# Altium schematic symbol library Schlib.SchLib: 725 symbols (part 4 of 6) (continued)
## RC0201FR-075R1L (continued)
SMD Chip Resistor, 5.1 Ohm, ï¿½ 1%, 50 mW, 0201 [0603 Metric], Thick Film, General Purpose; Manufacturer: Yageo; Manufacturer Part Number: RC0201FR-075R1L; Voltage Rating: 25V; Supplier: Future Electronics; Supplier Part Number: 8107900; RoHS: Yes; Category: Chip SMD Resistors; Stock: 70000; Pricing: 10000=0.0031, 50000=0.003, 300000=0.0028, 1000000=0.0027, 3000000=0.0025 (USD); RoHS Compliant: 5897YesNo; ComponentLink1URL: http://www.yageo.com/documents/recent/PYu-RC_Group_51_RoHS_L_9.pdf?src-supplier=Digikey; ComponentLink1Description: http://www.yageo.com/documents/recent/PYu-RC_Group_51_RoHS_L_9.pdf?src-supplier=Digikey; ComponentLink2URL: https://datasheet.octopart.com/RC0201FR-075R1L-Yageo-datasheet-164759695.pdf?src-supplier=Future+Electronics; ComponentLink2Description: https://datasheet.octopart.com/RC0201FR-075R1L-Yageo-datasheet-164759695.pdf?src-supplier=Future+Electronics; Case/Package: 0201
footprint R 0201 (0603 Metric)
pins: 1 B, 2 A

## RC0402FR-072K55L
designator R?  value 2.55kR  (hidden comment: *)
SMD Chip Resistor, 2.55 kOhm, ± 1%, 63 mW, 0402 [1005 Metric], Thick Film, General Purpose; Manufacturer: Yageo; Manufacturer Part Number: RC0402FR-072K55L; Supplier: Arrow Electronics; Supplier Part Number: RC0402FR-072K55L; RoHS: Yes; Category: Chip SMD Resistors; Stock: 50000; Pricing: 10000=0.0018, 50000=0.0015, 100000=0.001 (USD); ComponentLink1URL: https://datasheet.ciiva.com/12575/pyu-rc0402-51-rohs-l-6-r-8721-12575052.pdf?src-supplier=Mouser; ComponentLink1Description: https://datasheet.ciiva.com/12575/pyu-rc0402-51-rohs-l-6-r-8721-12575052.pdf?src-supplier=Mouser; Case/Package: 0201
footprint R 0402 (1005 Metric) (Chip Capacitor, Body 1.0x0.5mm, IPC High Density)
pins: 1 B, 2 A

## RC0402FR-0778K7L
designator R?  value 78.7kR  (hidden comment: *)
Res Thick Film 0402 78.7K Ohm 1% 1/16W ±100ppm/°C Molded SMD Paper T/R; Manufacturer: Yageo; Manufacturer Part Number: RC0402FR-0778K7L; Power Rating: 62.5mW; Voltage Rating: 50V; Max Power Dissipation: 63mW; Supplier: Future Electronics; Supplier Part Number: 7141302; RoHS: Yes; Category: Chip SMD Resistors; Stock: 430000; Pricing: 10000=0.0015, 50000=0.0015, 250000=0.0014, 500000=0.0013, 1500000=0.0012 (USD); Case/Package: 0402; Contact Plating: Tin,Matte; Case Code (Metric): 1005; Case Code (Imperial): 0402; Weight: 2.3E-05oz; Min Operating Temperature: -55°C; Max Operating Temperature: 155°C; Tolerance: 1%; Temperature Coefficient: 100ppm/°C; Package Quantity: 1; Packaging: Tape and Reel; Number of Terminations: 2; Termination: SMD/SMT; Features: Moisture Resistant; Series: RC; Construction: Rectangular; Voltage Rating (DC): 50V; Length: 1mm; Width: 0.02inch; Height: 0.016inch; Depth: 0.5mm; Military Standard: Not; RoHS Compliant: Yes; Lead Free: 5697LeadFree; ComponentLink1URL: https://datasheet.ciiva.com/2491/pyu-r-int-thick-7-2491262.pdf?src-supplier=Digikey; ComponentLink1Description: https://datasheet.ciiva.com/2491/pyu-r-int-thick-7-2491262.pdf?src-supplier=Digikey; ComponentLink2URL: https://datasheet.ciiva.com/2491/pyu-r-int-thick-7-2491263.pdf?src-supplier=Digikey; ComponentLink2Description: https://datasheet.ciiva.com/2491/pyu-r-int-thick-7-2491263.pdf?src-supplier=Digikey; ComponentLink3URL: https://datasheet.ciiva.com/2491/pyu-r-int-thick-7-2491261.pdf?src-supplier=Digikey; ComponentLink3Description: https://datasheet.ciiva.com/2491/pyu-r-int-thick-7-2491261.pdf?src-supplier=Digikey; ComponentLink4URL: https://datasheet.ciiva.com/5596/pyu-rc0402-51-rohs-l-6-r-5596046.pdf?src-supplier=Mouser; ComponentLink4Description: https://datasheet.ciiva.com/5596/pyu-rc0402-51-rohs-l-6-r-5596046.pdf?src-supplier=Mouser; ComponentLink5URL: https://datasheet.ciiva.com/8888/pyu-rc0402-51-rohs-l-6-8888223.pdf?src-supplier=Avnet; ComponentLink5Description: https://datasheet.ciiva.com/8888/pyu-rc0402-51-rohs-l-6-8888223.pdf?src-supplier=Avnet; ComponentLink6URL: https://datasheet.ciiva.com/17423/pyu-rc0402-51-rohs-l-6-r-17423799.pdf?src-supplier=Future+Electronics; ComponentLink6Description: https://datasheet.ciiva.com/17423/pyu-rc0402-51-rohs-l-6-r-17423799.pdf?src-supplier=Future+Electronics
footprint R 0402 (1005 Metric) (Chip Capacitor, Body 1.0x0.5mm, IPC High Density)
pins: 1 B, 2 A

## RC0402FR-07105KL
designator R?  value 105kR  (hidden comment: *)
SMD Chip Resistor, 105 kOhm, ± 1%, 63 mW, 0402 [1005 Metric], Thick Film, General Purpose; Manufacturer: Yageo; Manufacturer Part Number: RC0402FR-07105KL; Supplier: Future Electronics; Supplier Part Number: 9024258; RoHS: Yes; Category: Chip SMD Resistors; Stock: 200000; Pricing: 10000=0.0018, 100000=0.0011, 200000=0.0017, 300000=0.001, 750000=0.0016, 2000000=0.0009, 2500000=0.0016, 10000000=0.0014 (USD); ComponentLink1URL: https://datasheet.ciiva.com/12575/pyu-rc0402-51-rohs-l-6-r-8721-12575887.pdf?src-supplier=Mouser; ComponentLink1Description: https://datasheet.ciiva.com/12575/pyu-rc0402-51-rohs-l-6-r-8721-12575887.pdf?src-supplier=Mouser; ComponentLink2URL: https://datasheet.ciiva.com/8887/pyu-rc0402-51-rohs-l-6-8887815.pdf?src-supplier=Avnet; ComponentLink2Description: https://datasheet.ciiva.com/8887/pyu-rc0402-51-rohs-l-6-8887815.pdf?src-supplier=Avnet; Case/Package: 0402
footprint R 0402 (1005 Metric) (Chip Capacitor, Body 1.0x0.5mm, IPC High Density)
pins: 1 B, 2 A

## RC0402FR-07820KL
designator R?  value 820kR  (hidden comment: *)
SMD Chip Resistor, 820 kOhm, ± 1%, 63 mW, 0402 [1005 Metric], Thick Film, General Purpose; Manufacturer: Yageo; Manufacturer Part Number: RC0402FR-07820KL; Power Rating: 63mW; Voltage Rating: 50V; Temperature Coefficient: 100ppm/°C; Supplier: Arrow Electronics; Supplier Part Number: RC0402FR-07820KL; RoHS: Yes; Category: Chip SMD Resistors; Stock: 1100000; Pricing: 10000=0.0018, 50000=0.0011, 100000=0.001 (USD); Case/Package: 0402; Case Code (Imperial): 0402; Case Code (Metric): 1005; Min Operating Temperature: -55°C; Max Operating Temperature: 155°C; Tolerance: 1%; Packaging: Tape and Reel; Resistor Type: Thick Film; Number of Terminations: 2; Termination: SMD/SMT; Max Power Dissipation: 63mW; Features: Moisture Resistant; Series: RC; Construction: Rectangular; Resistance Tolerance: 1%; Technology: THICK FILM; Voltage Rating (AC): 50V; Length: 1mm; Width: 0.5mm; Height: 0.016inch; Depth: 0.5mm; Military Standard: Not; RoHS Compliant: Yes; Reach SVHC Compliant: Unknown; ComponentLink1URL: https://datasheet.ciiva.com/11808/0900766b80c66297-11808471.pdf?src-supplier=Rs; ComponentLink1Description: https://datasheet.ciiva.com/11808/0900766b80c66297-11808471.pdf?src-supplier=Rs; ComponentLink2URL: https://datasheet.ciiva.com/7850/1018594-7850102.pdf?src-supplier=Element14; ComponentLink2Description: https://datasheet.ciiva.com/7850/1018594-7850102.pdf?src-supplier=Element14; ComponentLink3URL: https://datasheet.ciiva.com/7850/1018594-7850101.pdf?src-supplier=Element14; ComponentLink3Description: https://datasheet.ciiva.com/7850/1018594-7850101.pdf?src-supplier=Element14
footprint R 0402 (1005 Metric) (Chip Capacitor, Body 1.0x0.5mm, IPC High Density)
pins: 1 B, 2 A

## RC0402FR-13453KL
designator R?  value 453kΩ  (hidden comment: *)
Fixed Resistor, Metal Glaze/thick Film, 0.0625W, 453000ohm, 50V, 1% +/-Tol, 100ppm/Cel, Surface Mount, 0402; Manufacturer: Yageo Group; Manufacturer Part Number: RC0402FR-13453KL; Power Dissipation: 62.5mW; Temperature Coefficient: 100ppm/°C; Supplier: DigiKey; Supplier Part Number: 13-RC0402FR-13453KLCT-ND; RoHS: Compliant; Category: Chip SMD Resistors; Stock: 67542; Pricing: 1=0.1, 10=0.02, 25=0.014, 50=0.0112, 100=0.009, 250=0.00688, 500=0.00566, 1000=0.00474, 5000=0.00328 (USD); Case/Package: 0402; China RoHS: Non-Compliant; Composition: Thick Film; Contact Plating: Tin; Height: 350µm; Lifecycle Status: Production; Max Operating Temperature: 155°C; Min Operating Temperature: -55°C; Mounting Technology: Surface Mount; Number of Terminals: 2; Packaging: Tape & Reel; REACH SVHC: Yes; Tolerance: 1%; Width: 500µm; Working Voltage: 50V; ComponentLink1URL: https://datasheet.octopart.com:443/RC0402FR-13453KL-Yageo-datasheet-175887523.pdf?src-supplier=IHS; ComponentLink1Description: https://datasheet.octopart.com:443/RC0402FR-13453KL-Yageo-datasheet-175887523.pdf?src-supplier=IHS; ComponentLink2URL: https://datasheet.octopart.com:443/RC0402FR-13453KL-Yageo-datasheet-164759695.pdf?src-supplier=Future+Electronics; ComponentLink2Description: https://datasheet.octopart.com:443/RC0402FR-13453KL-Yageo-datasheet-164759695.pdf?src-supplier=Future+Electronics; ComponentLink3URL: https://datasheet.octopart.com:443/RC0402FR-13453KL-Yageo-datasheet-137700087.pdf?src-supplier=Future+Electronics; ComponentLink3Description: https://datasheet.octopart.com:443/RC0402FR-13453KL-Yageo-datasheet-137700087.pdf?src-supplier=Future+Electronics; ComponentLink4URL: https://datasheet.octopart.com/RC0402FR-13453KL-Yageo-datasheet-73766026.pdf; ComponentLink4Description: https://datasheet.octopart.com/RC0402FR-13453KL-Yageo-datasheet-73766026.pdf; ComponentLink5URL: https://datasheet.octopart.com:443/RC0402FR-13453KL-Yageo-datasheet-10408619.pdf?src-supplier=_legacy+Avnet; ComponentLink5Description: https://datasheet.octopart.com:443/RC0402FR-13453KL-Yageo-datasheet-10408619.pdf?src-supplier=_legacy+Avnet; ComponentLink6URL: http://sigma.octopart.com:80/rohs_statement/Yageo-company-2.pdf?src-supplier=Compliance+Statements; ComponentLink6Description: http://sigma.octopart.com:80/rohs_statement/Yageo-company-2.pdf?src-supplier=Compliance+Statements; ComponentLink7URL: http://sigma.octopart.com:80/conflict_mineral_statement/Yageo-company-3.pdf?src-supplier=Compliance+Statements; ComponentLink7Description: http://sigma.octopart.com:80/conflict_mineral_statement/Yageo-company-3.pdf?src-supplier=Compliance+Statements
footprint R 0402 (1005 Metric) (Chip Capacitor, Body 1.0x0.5mm, IPC High Density)
pins: 1 B, 2 A

## RC0805JR-070RL
designator R?  value 0mR  (hidden comment: *)
Zero Ohm Resistor, Jumper, 0805 [2012 Metric], Thick Film, 125 mW, 2 A, Surface Mount; Manufacturer: Yageo; Manufacturer Part Number: RC0805JR-070RL; Tolerance: 5%; Voltage Rating: 150V; Power Rating: 125mW; Temperature Coefficient: 200ppm/°C; Supplier: Arrow Electronics; Supplier Part Number: RC0805JR-070RL; RoHS: Yes; Category: Chip SMD Resistors; Stock: 21; Pricing: 1=0.0647, 10=0.016, 25=0.0144, 100=0.007, 250=0.0069, 1000=0.0051, 3000=0.0023 (USD); Case/Package: 0805; Pins: 2; Contact Plating: Tin,Matte; Case Code (Imperial): 0805; Case Code (Metric): 2012; Min Operating Temperature: -55°C; Max Operating Temperature: 155°C; Resistor Type: Thick Film; Packaging: Tape and Reel; Voltage Rating (DC): 150V; Termination: SMD/SMT; Features: Moisture Resistant; Series: RC; Max Power Dissipation: 125mW; Number of Terminations: 2; Construction: Rectangular; Technology: THICK FILM; Resistance Tolerance: 5%; Length: 2mm; Width: 1.25mm; Height: 0.5mm; Depth: 1.25mm; RoHS Compliant: Yes; Military Standard: Not; Reach SVHC Compliant: Unknown; Lead Free: 5697LeadFree; ComponentLink1URL: https://datasheet.ciiva.com/11819/0900766b8106beab-11819430.pdf?src-supplier=Rs; ComponentLink1Description: https://datasheet.ciiva.com/11819/0900766b8106beab-11819430.pdf?src-supplier=Rs; ComponentLink2URL: https://datasheet.ciiva.com/7941/1738694-7941861.pdf?src-supplier=Element14; ComponentLink2Description: https://datasheet.ciiva.com/7941/1738694-7941861.pdf?src-supplier=Element14; ComponentLink3URL: https://datasheet.ciiva.com/7941/1738694-7941862.pdf?src-supplier=Element14; ComponentLink3Description: https://datasheet.ciiva.com/7941/1738694-7941862.pdf?src-supplier=Element14; ComponentLink4URL: https://datasheet.ciiva.com/7941/1738694-7941863.pdf?src-supplier=Element14; ComponentLink4Description: https://datasheet.ciiva.com/7941/1738694-7941863.pdf?src-supplier=Element14; ComponentLink5URL: https://datasheet.ciiva.com/15190/getdatasheetpartid-330685-15190028.pdf?src-supplier=Verical; ComponentLink5Description: https://datasheet.ciiva.com/15190/getdatasheetpartid-330685-15190028.pdf?src-supplier=Verical
footprint R 0805
pins: 1 B, 2 A

## RCLAMP0561Z.TFT
designator D?  (value not drawn)
ESD Suppressor Diode TVS Bi-Dir 5.5V 2-Pin SGP0603P2X3 T/R; Manufacturer: Semtech; Manufacturer Part Number: RCLAMP0561Z.TFT; Supplier: Arrow Electronics; Supplier Part Number: RCLAMP0561Z.TFT; RoHS: Yes; Category: TVS Diodes; Stock: 15000; Pricing: 15000=0.1484, 45000=0.1472 (USD); RoHS Compliant: Yes; ComponentLink1URL: https://semtech.my.salesforce.com/sfc/p/E0000000JelG/a/2R0000001Nhw/rLxDnZC3pmo7yy9aJa.8vlqwsZ.35AYi_qv_JnzGISY?src-supplier=Digikey; ComponentLink1Description: https://semtech.my.salesforce.com/sfc/p/E0000000JelG/a/2R0000001Nhw/rLxDnZC3pmo7yy9aJa.8vlqwsZ.35AYi_qv_JnzGISY?src-supplier=Digikey; Case/Package: 0201
footprint 0201 Diod (DIODFN60X30X36-2N)
pins: 1, 2

## RCS080547R0FKEA
designator R?  value 47R  (hidden comment: *)
Res Thick Film 0805 47 Ohm 1% 0.4W ±100ppm/°C Pad SMD Automotive Medical T/R; Manufacturer: Vishay Dale; Manufacturer Part Number: RCS080547R0FKEA; Max Power Dissipation: 400mW; Supplier: Mouser; Supplier Part Number: 71-RCS080547R0FKEA; RoHS: Yes; Category: Chip SMD Resistors; Stock: 13504; Pricing: 1=0.13, 10=0.044, 50=0.044, 100=0.027, 1000=0.024, 10000=0.021 (USD); Case/Package: 0805; Min Operating Temperature: -55°C; Max Operating Temperature: 155°C; Package Quantity: 5000; Packaging: Tape and Reel; Number of Terminations: 2; Tolerance: 1%; Temperature Coefficient: 100ppm/°C; Features: Automotive AEC-Q200; Series: RCS; Length: 0.079inch; Width: 0.049inch; Height: 0.02inch; ComponentLink1URL: http://www.vishay.com/docs/20065/rcse3.pdf?src-supplier=Digikey; ComponentLink1Description: http://www.vishay.com/docs/20065/rcse3.pdf?src-supplier=Digikey
footprint R 0805
pins: 1 B, 2 A

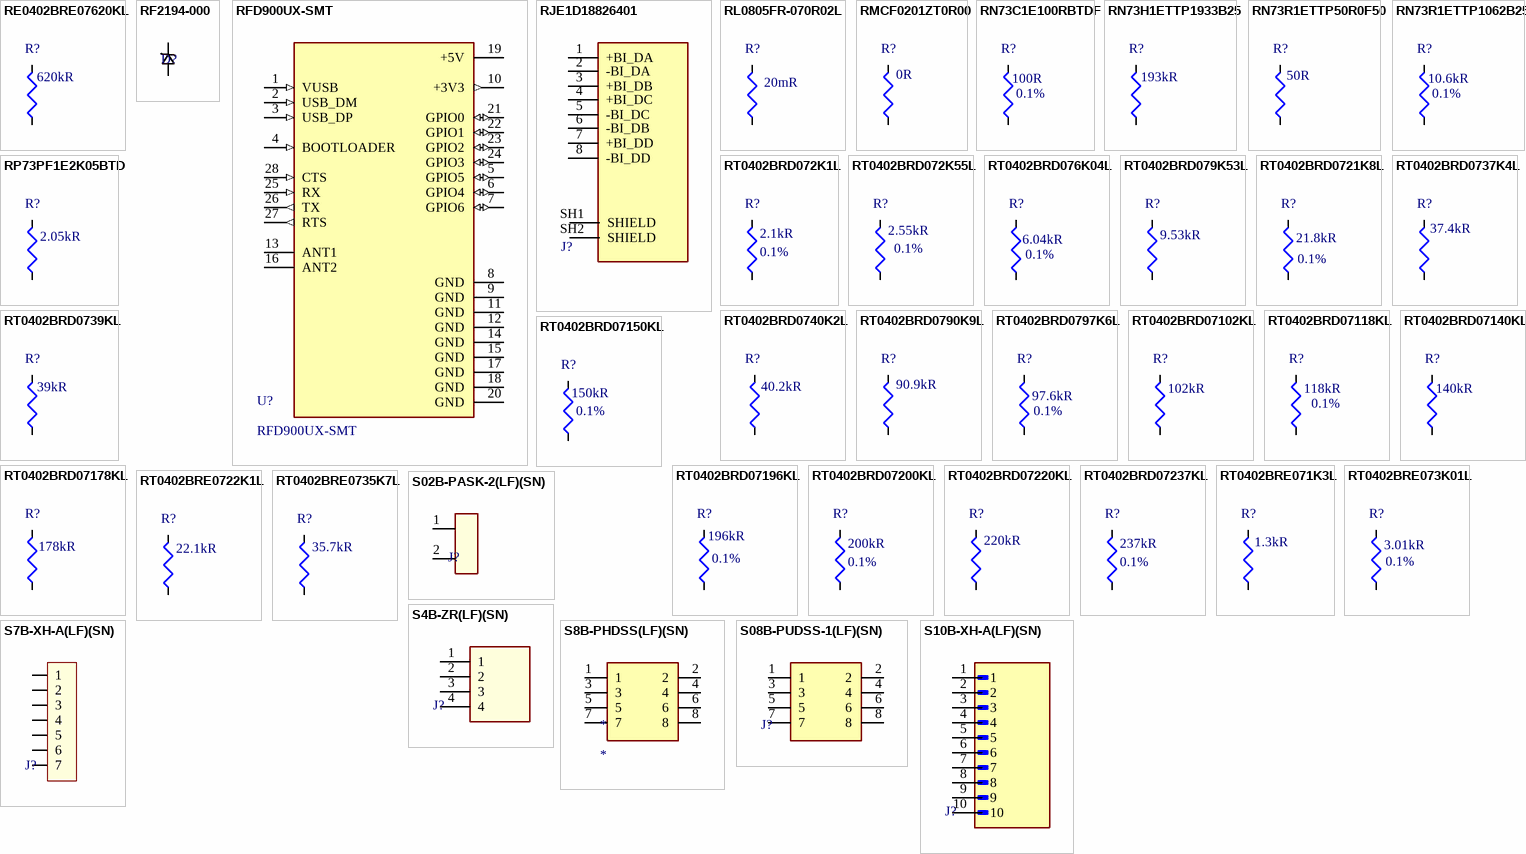
[diagram p16: symbols RE0402BRE07620KL to S10B-XH-A(LF)(SN)]

## RE0402BRE07620KL
designator R?  value 620kR  (hidden comment: *)
Res Thick Film 0402 620K Ohm 0.5% 1/16W ±50ppm/°C Molded SMD Paper T/R; Manufacturer: Yageo; Manufacturer Part Number: RE0402BRE07620KL; Tolerance: 0.1%; Max Power Dissipation: 63mW; Supplier: Digikey; Supplier Part Number: 13-RE0402BRE07620KLCT-ND; RoHS: Yes; Category: Chip SMD Resistors; Stock: 9850; Pricing: 1=0.39, 10=0.163, 50=0.1418, 100=0.1204, 500=0.09078, 1000=0.08058, 5000=0.06324 (USD); Case/Package: 0402; Min Operating Temperature: -55°C; Max Operating Temperature: 155°C; Packaging: Tape and Reel; Number of Terminations: 2; Temperature Coefficient: 50ppm/°C; Features: Moisture Resistant; Series: RE; Length: 0.039inch; Width: 0.02inch; Height: 0.015inch; RoHS Compliant: Yes; ComponentLink1URL: http://www.yageo.com/NewPortal/yageodocoutput?fileName=/pdf/R-Chip/PYu-RE_105_RoHS_L_6.pdf&src-supplier=Digikey; ComponentLink1Description: http://www.yageo.com/NewPortal/yageodocoutput?fileName=/pdf/R-Chip/PYu-RE_105_RoHS_L_6.pdf&src-supplier=Digikey
footprint R 0402 (1005 Metric) (Chip Capacitor, Body 1.0x0.5mm, IPC High Density)
pins: 1 B, 2 A

## RF2194-000
designator D?  (value not drawn)
Unidirectional, Silicon, Tvs Diode, Halogen Free And Rohs Compliant, Plastic, 0402, XDFN-2; Manufacturer: TE Connectivity; Manufacturer Part Number: RF2194-000; Direction: 210Direction; Clamping Voltage: -800mV; Breakdown Voltage: 9V; Element Configuration: 5460ElementConfiguration; ESD Protection: 5897YesNo; Supplier: Arrow Electronics; Supplier Part Number: SESD0402X1UN-0020-090; RoHS: No; Category: TVS Diodes; Stock: 6099; Pricing: 1=0.0681, 10=0.0672, 25=0.0662, 50=0.0653, 100=0.0643, 250=0.0634, 500=0.0624, 1000=0.0615, 3000=0.0605, 6000=0.0596 (USD); Mounting Technology: Surface Mount; Case/Package: 343Case; Pins: 2; Case Code (Metric): 3668CaseCodeMetric; Min Operating Temperature: -55°C; Max Operating Temperature: -125°C; Packaging: Cut Tape; Termination: SMD/SMT; Length: 1mm; Width: 360um; Height: 270um; Depth: 600um; Reach SVHC Compliant: Unknown; ELV: 5681ELVCompliant; ComponentLink1URL: https://datasheet.ciiva.com/25624/0900766b81130dc0-25624861.pdf?src-supplier=Rs; ComponentLink1Description: https://datasheet.ciiva.com/25624/0900766b81130dc0-25624861.pdf?src-supplier=Rs; ComponentLink2URL: https://datasheet.ciiva.com/46390/1631371-46390885.pdf?src-supplier=Element14; ComponentLink2Description: https://datasheet.ciiva.com/46390/1631371-46390885.pdf?src-supplier=Element14; ComponentLink3URL: https://datasheet.ciiva.com/7635/1631371-7635512.pdf?src-supplier=Element14; ComponentLink3Description: https://datasheet.ciiva.com/7635/1631371-7635512.pdf?src-supplier=Element14
footprint RF2194-000
pins: 1, 2 (power)

## RFD900UX-SMT
designator U?
Long-range radio data modem operating in the 902-928MHz or 868-870MHz frequency band; MAnufacturer Part Number: RFD900UX-SMT
footprint RFD900
pins: 1 VUSB (in), 2 USB_DM (in), 3 USB_DP (in), 4 BOOTLOADER (in), 5 GPIO5 (io), 6 GPIO4 (io), 7 GPIO6 (io), 8 GND (power), 9 GND (power), 10 +3V3 (out), 11 GND (power), 12 GND (power), 13 ANT1, 14 GND (power), 15 GND (power), 16 ANT2, 17 GND (power), 18 GND (power), 19 +5V (power), 20 GND (power), 21 GPIO0 (io), 22 GPIO1 (io), 23 GPIO2 (io), 24 GPIO3 (io), 25 RX (in), 26 TX (out), 27 RTS (out), 28 CTS (in)

## RJE1D18826401
designator J?
Standard Profile, Tab Down CAT5E RJ45 - 1 Port without LED, with Shield without EMI Tabs; Manufacturer: Amphenol Communications Solutions; Manufacturer Part Number: RJE1D18826401; Supplier: Mouser; Supplier Part Number: 523-RJE1D18826401; Category: Modular / Ethernet Connectors; Stock: 1067; Pricing: 1=3.42, 10=2.73, 50=2.59, 100=2.47, 1000=2.1, 10000=2.08 (USD)
footprint RJE1D18826401
pins: 1 +BI_DA, 2 -BI_DA, 3 +BI_DB, 4 +BI_DC, 5 -BI_DC, 6 -BI_DB, 7 +BI_DD, 8 -BI_DD (power), SH1 SHIELD, SH2 SHIELD

## RL0805FR-070R02L
designator R?  value 20mR  (hidden comment: *)
Res Thick Film 0805 0.02 Ohm 1% 1/8W ±1200ppm/°C Molded SMD SMD Paper T/R; Manufacturer: Yageo; Manufacturer Part Number: RL0805FR-070R02L; Supplier: Arrow Electronics; Supplier Part Number: RL0805FR-070R02L; RoHS: Yes; Category: Chip SMD Resistors; Stock: 917; Pricing: 1=0.3155, 10=0.1816, 25=0.164, 100=0.142, 250=0.1254, 500=0.0679 (USD); ComponentLink1URL: http://www.mouser.com/ds/2/447/PYu-RL_521_RoHS_L_5-2927.pdf?src-supplier=Mouser; ComponentLink1Description: http://www.mouser.com/ds/2/447/PYu-RL_521_RoHS_L_5-2927.pdf?src-supplier=Mouser; ComponentLink2URL: https://datasheet.octopart.com/RL0805FR-070R02L-Yageo-datasheet-83209227.pdf?src-supplier=Future+Electronics; ComponentLink2Description: https://datasheet.octopart.com/RL0805FR-070R02L-Yageo-datasheet-83209227.pdf?src-supplier=Future+Electronics; ComponentLink3URL: http://www.yageo.com/documents/recent/PYu-RL_Group_521_RoHS_L_2.pdf?src-supplier=Digikey; ComponentLink3Description: http://www.yageo.com/documents/recent/PYu-RL_Group_521_RoHS_L_2.pdf?src-supplier=Digikey; ComponentLink4URL: http://www.yageo.com/exep/pages/download/literatures/R-chip_current%20sensor_20140512.pdf?src-supplier=Digikey; ComponentLink4Description: http://www.yageo.com/exep/pages/download/literatures/R-chip_current%20sensor_20140512.pdf?src-supplier=Digikey; Case/Package: 0805
footprint R 0805
pins: 1 B, 2 A

## RMCF0201ZT0R00
designator R?  value 0R  (hidden comment: *)
Res Thick Film 0201 0 Ohm Jumper Molded SMD Paper T/R; Manufacturer: Stackpole Electronics; Manufacturer Part Number: RMCF0201ZT0R00; Voltage Rating: 25V; Supplier: Mouser; Supplier Part Number: 708-RMCF0201ZT0R00; RoHS: Yes; Category: Chip SMD Resistors; Stock: 435831; Pricing: 1=0.1, 10=0.01, 50=0.01, 100=0.006, 1000=0.004, 10000=0.002 (USD); Lead Free: 5697LeadFree; ComponentLink1URL: http://www.seielect.com/Catalog/SEI-RMC.pdf?src-supplier=Future+Electronics; ComponentLink1Description: http://www.seielect.com/Catalog/SEI-RMC.pdf?src-supplier=Future+Electronics; ComponentLink2URL: https://datasheet.octopart.com/RMCF0201ZT0R00-Stackpole-Electronics-datasheet-11547379.pdf?src-supplier=Future+Electronics; ComponentLink2Description: https://datasheet.octopart.com/RMCF0201ZT0R00-Stackpole-Electronics-datasheet-11547379.pdf?src-supplier=Future+Electronics; ComponentLink3URL: https://www.seielect.com/catalog/SEI-Packaging.pdf?src-supplier=Digikey; ComponentLink3Description: https://www.seielect.com/catalog/SEI-Packaging.pdf?src-supplier=Digikey; ComponentLink4URL: https://www.seielect.com/catalog/SEI-RMCF_RMCP.pdf?src-supplier=Avnet; ComponentLink4Description: https://www.seielect.com/catalog/SEI-RMCF_RMCP.pdf?src-supplier=Avnet; ComponentLink5URL: https://datasheet.octopart.com/RMCF0201ZT0R00-Stackpole-Electronics-datasheet-155966809.pdf?src-supplier=Master+Electronics; ComponentLink5Description: https://datasheet.octopart.com/RMCF0201ZT0R00-Stackpole-Electronics-datasheet-155966809.pdf?src-supplier=Master+Electronics; Case/Package: 0201
footprint R 0201 (0603 Metric)
pins: 1 B, 2 A

## RN73C1E100RBTDF
designator R?  value 100R  Tolerance: 0.1%  (hidden comment: *)
Res Thin Film 0402 100 Ohm 0.1% 0.063W(1/16W) ±10ppm/C Pad SMD T/R; Manufacturer: TE Connectivity; Manufacturer Part Number: RN73C1E100RBTDF; Number of Resistors: 1NUMBER; Supplier: Mouser; Supplier Part Number: 279-RN73C1E100RBTDF; RoHS: Yes; Category: Chip SMD Resistors; Stock: 67; Pricing: 1=1.14, 10=0.806, 50=0.61, 100=0.538, 1000=0.395, 10000=0.386 (USD); Mounting Technology: 8Mount; Termination: 4558ConnectorType; Height: 350um; ComponentLink1URL: http://components.arrow.com/part/dataview/43802547S8980225N7887?src-supplier=Arrow+Electronics; ComponentLink1Description: http://components.arrow.com/part/dataview/43802547S8980225N7887?src-supplier=Arrow+Electronics; ComponentLink2URL: http://datasheet.octopart.com/RN73C1E100RBTDF-TE-Connectivity-datasheet-67796562.pdf?src-supplier=Mouser; ComponentLink2Description: http://datasheet.octopart.com/RN73C1E100RBTDF-TE-Connectivity-datasheet-67796562.pdf?src-supplier=Mouser; ComponentLink3URL: http://datasheet.octopart.com/RN73C1E100RBTDF-TE-Connectivity-datasheet-67796562.pdf?src-supplier=Future+Electronics; ComponentLink3Description: http://datasheet.octopart.com/RN73C1E100RBTDF-TE-Connectivity-datasheet-67796562.pdf?src-supplier=Future+Electronics; ComponentLink4URL: http://datasheet.octopart.com/RN73C1E100RBTDF-TE-Connectivity-datasheet-67796562.pdf?src-supplier=Onlinecomponents.com; ComponentLink4Description: http://datasheet.octopart.com/RN73C1E100RBTDF-TE-Connectivity-datasheet-67796562.pdf?src-supplier=Onlinecomponents.com; ComponentLink5URL: http://datasheet.octopart.com/RN73C1E100RBTDF-TE-Connectivity-datasheet-67796562.pdf?src-supplier=Verical; ComponentLink5Description: http://datasheet.octopart.com/RN73C1E100RBTDF-TE-Connectivity-datasheet-67796562.pdf?src-supplier=Verical; ComponentLink6URL: http://datasheet.octopart.com/RN73C1E100RBTDF-TE-Connectivity-datasheet-67796562.pdf?src-supplier=Digikey; ComponentLink6Description: http://datasheet.octopart.com/RN73C1E100RBTDF-TE-Connectivity-datasheet-67796562.pdf?src-supplier=Digikey; ComponentLink7URL: http://datasheet.octopart.com/RN73C1E100RBTDF-TE-Connectivity-datasheet-67796562.pdf?src-supplier=Farnell; ComponentLink7Description: http://datasheet.octopart.com/RN73C1E100RBTDF-TE-Connectivity-datasheet-67796562.pdf?src-supplier=Farnell; ComponentLink8URL: http://datasheet.octopart.com/RN73C1E100RBTDF-TE-Connectivity-datasheet-67796562.pdf?src-supplier=Avnet; ComponentLink8Description: http://datasheet.octopart.com/RN73C1E100RBTDF-TE-Connectivity-datasheet-67796562.pdf?src-supplier=Avnet; ComponentLink9URL: https://datasheet.octopart.com/RN73C1E100RBTDF-TE-Connectivity-datasheet-16646297.pdf?src-supplier=Element14; ComponentLink9Description: https://datasheet.octopart.com/RN73C1E100RBTDF-TE-Connectivity-datasheet-16646297.pdf?src-supplier=Element14; ComponentLink10URL: https://datasheet.octopart.com/RN73C1E100RBTDF-TE-Connectivity-datasheet-67796562.pdf?src-supplier=Newark; ComponentLink10Description: https://datasheet.octopart.com/RN73C1E100RBTDF-TE-Connectivity-datasheet-67796562.pdf?src-supplier=Newark; ComponentLink11URL: http://datasheet.octopart.com/RN73C1E100RBTDF-TE-Connectivity-datasheet-67796562.pdf?src-supplier=Distrelec; ComponentLink11Description: http://datasheet.octopart.com/RN73C1E100RBTDF-TE-Connectivity-datasheet-67796562.pdf?src-supplier=Distrelec; ComponentLink12URL: http://datasheet.octopart.com/RN73C1E100RBTDF-TE-Connectivity-datasheet-67796562.pdf?src-supplier=Electro+Sonic; ComponentLink12Description: http://datasheet.octopart.com/RN73C1E100RBTDF-TE-Connectivity-datasheet-67796562.pdf?src-supplier=Electro+Sonic; ComponentLink13URL: http://datasheet.octopart.com/RN73C1E100RBTDF-TE-Connectivity-datasheet-67796562.pdf?src-supplier=Heilind+Electronics; ComponentLink13Description: http://datasheet.octopart.com/RN73C1E100RBTDF-TE-Connectivity-datasheet-67796562.pdf?src-supplier=Heilind+Electronics; ComponentLink14URL: http://datasheet.octopart.com/RN73C1E100RBTDF-TE-Connectivity-datasheet-67796562.pdf?src-supplier=Interstate+Connecting+Components; ComponentLink14Description: http://datasheet.octopart.com/RN73C1E100RBTDF-TE-Connectivity-datasheet-67796562.pdf?src-supplier=Interstate+Connecting+Components; Case/Package: 0402
footprint R 0402 (1005 Metric) (Chip Capacitor, Body 1.0x0.5mm, IPC High Density)
pins: 1 B, 2 A

## RN73H1ETTP1933B25
designator R?  value 193kR  (hidden comment: *)
Res 193K Ohm 0.1% 1/16W 0402; Manufacturer: KOA Speer; Manufacturer Part Number: RN73H1ETTP1933B25; Temperature Coefficient: 25ppm/°C; Power Rating: 63mW; Voltage Rating: 50V; Supplier: Digikey; Supplier Part Number: 2019-RN73H1ETTP1933B25CT-ND; RoHS: Yes; Category: Chip SMD Resistors; Stock: 19995; Pricing: 1000=0.11125 (USD); Case/Package: 0402; Case Code (Imperial): 0402; Case Code (Metric): 1005; Min Operating Temperature: -55°C; Max Operating Temperature: 155°C; Tolerance: 0.1%; Packaging: Tape and Reel; Package Quantity: 10000; Height: 400um; ComponentLink1URL: http://www.mouser.com/ds/2/219/RN73H-12200.pdf?src-supplier=Mouser; ComponentLink1Description: http://www.mouser.com/ds/2/219/RN73H-12200.pdf?src-supplier=Mouser
footprint R 0402 (1005 Metric) (Chip Capacitor, Body 1.0x0.5mm, IPC High Density)
pins: 1 B, 2 A

## RN73R1ETTP50R0F50
designator R?  value 50R  (hidden comment: *)
Fixed Resistor, Thin Film, 0.063W, 50ohm, 50V, 1% +/-Tol, 50ppm/Cel, Surface Mount, 0402; Manufacturer: KOA Speer; Manufacturer Part Number: RN73R1ETTP50R0F50; Supplier: Digikey; Supplier Part Number: 2019-RN73R1ETTP50R0F50CT-ND; RoHS: No; Category: Chip SMD Resistors; Stock: 6336; Pricing: 1=0.22, 10=0.155, 50=0.1218, 100=0.1093, 500=0.08386, 1000=0.07432, 5000=0.05502 (USD); Case/Package: 0402
footprint R 0402 (1005 Metric) (Chip Capacitor, Body 1.0x0.5mm, IPC High Density)
pins: 1 B, 2 A

## RN73R1ETTP1062B25
designator R?  value 10.6kR  Tolerance: 0.1%  (hidden comment: *)
Res 10.6K Ohm 0.1% 1/16W 0402; Manufacturer: KOA Speer; Manufacturer Part Number: RN73R1ETTP1062B25; Supplier: Digikey; Supplier Part Number: 2019-RN73R1ETTP1062B25CT-ND; RoHS: Yes; Category: Chip SMD Resistors; Stock: 8750; Pricing: 1=0.21, 10=0.156, 50=0.1222, 100=0.1091, 500=0.0824, 1000=0.07258, 5000=0.05346 (USD); Case/Package: 0402
footprint R 0402 (1005 Metric) (Chip Capacitor, Body 1.0x0.5mm, IPC High Density)
pins: 1 B, 2 A

## RP73PF1E2K05BTD
designator R?  value 2.05kR  (hidden comment: *)
Res Thin Film 0402 2.05K Ohm 0.1% 0.1W(1/10W) ±25ppm/C Pad SMD T/R Medical; Manufacturer: TE Connectivity; Manufacturer Part Number: RP73PF1E2K05BTD; Power Rating: 100mW; Voltage Rating: 50V; Supplier: Digikey; Supplier Part Number: A127349CT-ND; RoHS: Yes; Category: Chip SMD Resistors; Stock: 8196; Pricing: 1=0.28, 10=0.208, 50=0.1624, 100=0.1449, 500=0.10948, 1000=0.09645 (USD); Voltage Rating (DC): 50V; Height: 350um; ComponentLink1URL: https://www.te.com/commerce/DocumentDelivery/DDEController?Action=srchrtrv&amp;DocNm=1773272&amp;DocType=DS&amp;DocLang=English&src-supplier=Digikey; ComponentLink1Description: https://www.te.com/commerce/DocumentDelivery/DDEController?Action=srchrtrv&amp;DocNm=1773272&amp;DocType=DS&amp;DocLang=English&src-supplier=Digikey; Case/Package: 0402
footprint R 0402 (1005 Metric) (Chip Capacitor, Body 1.0x0.5mm, IPC High Density)
pins: 1 B, 2 A

## RT0402BRD072K1L
designator R?  value 2.1kR  Tolerance: 0.1%  (hidden comment: *)
Res Thin Film 0402 2.1K Ohm 0.1% 1/16W ±25ppm/°C Molded SMD Paper T/R; Manufacturer: Yageo; Manufacturer Part Number: RT0402BRD072K1L; Supplier: Digikey; Supplier Part Number: YAG1401CT-ND; RoHS: Yes; Category: Chip SMD Resistors; Stock: 23901; Pricing: 1=0.16, 10=0.121, 50=0.0958, 100=0.0859, 500=0.0654, 1000=0.0578, 5000=0.04283 (USD); ComponentLink1URL: https://datasheet.ciiva.com/12724/pyu-rt-1-to-0-05-rohs-l-4-12724118.pdf?src-supplier=Mouser; ComponentLink1Description: https://datasheet.ciiva.com/12724/pyu-rt-1-to-0-05-rohs-l-4-12724118.pdf?src-supplier=Mouser; ComponentLink2URL: https://datasheet.ciiva.com/2582/pyu-rt-1-to-0-05-rohs-l-4-2582282.pdf?src-supplier=Digikey; ComponentLink2Description: https://datasheet.ciiva.com/2582/pyu-rt-1-to-0-05-rohs-l-4-2582282.pdf?src-supplier=Digikey
footprint R 0402 (1005 Metric) (Chip Capacitor, Body 1.0x0.5mm, IPC High Density)
pins: 1 B, 2 A

## RT0402BRD072K55L
designator R?  value 2.55kR  Tolerance: 0.1%  (hidden comment: *)
Res Thin Film 0402 2.55K Ohm 0.1% 0.063W(1/16W) ±25ppm/C Pad SMD T/R; Manufacturer: Yageo; Manufacturer Part Number: RT0402BRD072K55L; Supplier: Digikey; Supplier Part Number: YAG4233CT-ND; RoHS: Yes; Category: Chip SMD Resistors; Stock: 15235; Pricing: 1=0.16, 10=0.123, 50=0.098, 100=0.0877, 500=0.07038, 1000=0.06222, 5000=0.0459 (USD); ComponentLink1URL: https://datasheet.ciiva.com/12725/pyu-rt-1-to-0-05-rohs-l-4-12725359.pdf?src-supplier=Mouser; ComponentLink1Description: https://datasheet.ciiva.com/12725/pyu-rt-1-to-0-05-rohs-l-4-12725359.pdf?src-supplier=Mouser; ComponentLink2URL: https://datasheet.ciiva.com/2582/pyu-rt-1-to-0-05-rohs-l-5-2582291.pdf?src-supplier=Digikey; ComponentLink2Description: https://datasheet.ciiva.com/2582/pyu-rt-1-to-0-05-rohs-l-5-2582291.pdf?src-supplier=Digikey; Case/Package: 0402
footprint R 0402 (1005 Metric) (Chip Capacitor, Body 1.0x0.5mm, IPC High Density)
pins: 1 B, 2 A

## RT0402BRD076K04L
designator R?  value 6.04kR  Tolerance: 0.1%  (hidden comment: *)
SMD Chip Resistor, 6.04 kOhm, ± 0.1%, 63 mW, 0402 [1005 Metric], Thin Film, High Precision High Stability; Manufacturer: Yageo; Manufacturer Part Number: RT0402BRD076K04L; Voltage Rating (DC): 50V; Supplier: Digikey; Supplier Part Number: YAG4301CT-ND; RoHS: Yes; Category: Chip SMD Resistors; Stock: 3640; Pricing: 1=0.17, 10=0.122, 50=0.0958, 100=0.0867, 500=0.0663, 1000=0.05814, 5000=0.04386 (USD); ComponentLink1URL: https://datasheet.ciiva.com/12723/pyu-rt-1-to-0-05-rohs-l-4-12723384.pdf?src-supplier=Mouser; ComponentLink1Description: https://datasheet.ciiva.com/12723/pyu-rt-1-to-0-05-rohs-l-4-12723384.pdf?src-supplier=Mouser; ComponentLink2URL: https://datasheet.ciiva.com/2582/pyu-rt-1-to-0-05-rohs-l-5-2582475.pdf?src-supplier=Digikey; ComponentLink2Description: https://datasheet.ciiva.com/2582/pyu-rt-1-to-0-05-rohs-l-5-2582475.pdf?src-supplier=Digikey; Case/Package: 0402
footprint R 0402 (1005 Metric) (Chip Capacitor, Body 1.0x0.5mm, IPC High Density)
pins: 1 B, 2 A

## RT0402BRD079K53L
designator R?  value 9.53kR  (hidden comment: *)
Res Thin Film 0402 9.53K Ohm 0.1% 1/16W ±25ppm/°C Molded SMD Paper T/R; Manufacturer: Yageo; Manufacturer Part Number: RT0402BRD079K53L; Supplier: Arrow Electronics; Supplier Part Number: RT0402BRD079K53L; RoHS: Yes; Category: Chip SMD Resistors; Stock: 17759; Pricing: 1=0.081, 10=0.061, 25=0.0484, 100=0.0434, 250=0.0429, 500=0.033, 1000=0.0232, 3000=0.0226, 6000=0.022, 15000=0.0214 (USD); ComponentLink1URL: https://datasheet.ciiva.com/12797/pyu-rt-1-to-0-05-rohs-l-4-12797068.pdf?src-supplier=Mouser; ComponentLink1Description: https://datasheet.ciiva.com/12797/pyu-rt-1-to-0-05-rohs-l-4-12797068.pdf?src-supplier=Mouser; ComponentLink2URL: https://datasheet.ciiva.com/2582/pyu-rt-1-to-0-05-rohs-l-5-2582542.pdf?src-supplier=Digikey; ComponentLink2Description: https://datasheet.ciiva.com/2582/pyu-rt-1-to-0-05-rohs-l-5-2582542.pdf?src-supplier=Digikey; Case/Package: 0402
footprint R 0402 (1005 Metric) (Chip Capacitor, Body 1.0x0.5mm, IPC High Density)
pins: 1 B, 2 A

## RT0402BRD0721K8L
designator R?  value 21.8kR  Tolerance: 0.1%  (hidden comment: *)
High Precision-High Stability Chip Resistor Thin Film 0402 21.8kOhm 0.1% Paper T/R; Manufacturer: Yageo; Manufacturer Part Number: RT0402BRD0721K8L; Supplier: Digikey; Supplier Part Number: 13-RT0402BRD0721K8LCT-ND; RoHS: No; Category: Chip SMD Resistors; Stock: 18775; Pricing: 1=0.16, 10=0.123, 50=0.098, 100=0.0877, 500=0.0663, 1000=0.05814, 5000=0.04386 (USD)
footprint R 0402 (1005 Metric) (Chip Capacitor, Body 1.0x0.5mm, IPC High Density)
pins: 1 B, 2 A

## RT0402BRD0737K4L
designator R?  value 37.4kR  (hidden comment: *)
Res Thin Film 0402 37.4K Ohm 0.1% 0.063W(1/16W) ±25ppm/°C Pad SMD T/R; Manufacturer: Yageo; Manufacturer Part Number: RT0402BRD0737K4L; Voltage Rating (DC): 50V; Supplier: Future Electronics; Supplier Part Number: 3009580; RoHS: Yes; Category: Chip SMD Resistors; Stock: 10000; Pricing: 10000=0.0369, 20000=0.0361, 30000=0.0356, 50000=0.035, 100000=0.0337 (USD); Width: 500um; ComponentLink1URL: http://www.mouser.com/ds/2/447/yageodocoutput-1125656.pdf?src-supplier=Mouser; ComponentLink1Description: http://www.mouser.com/ds/2/447/yageodocoutput-1125656.pdf?src-supplier=Mouser; ComponentLink2URL: http://www.yageo.com/documents/recent/PYu-RT_1-to-0.01_RoHS_L_10.pdf?src-supplier=Digikey; ComponentLink2Description: http://www.yageo.com/documents/recent/PYu-RT_1-to-0.01_RoHS_L_10.pdf?src-supplier=Digikey; ComponentLink3URL: http://www.yageo.com/documents/recent/PYu-RT_1-to-0.01_RoHS_L_9.pdf?src-supplier=Digikey; ComponentLink3Description: http://www.yageo.com/documents/recent/PYu-RT_1-to-0.01_RoHS_L_9.pdf?src-supplier=Digikey; ComponentLink4URL: https://datasheet.octopart.com/RT0402BRD0737K4L-Yageo-datasheet-166250672.pdf?src-supplier=Future+Electronics; ComponentLink4Description: https://datasheet.octopart.com/RT0402BRD0737K4L-Yageo-datasheet-166250672.pdf?src-supplier=Future+Electronics; Case/Package: 0402
footprint R 0402 (1005 Metric) (Chip Capacitor, Body 1.0x0.5mm, IPC High Density)
pins: 1 B, 2 A

## RT0402BRD0739KL
designator R?  value 39kR  (hidden comment: *)
SMD Chip Resistor, 39 kOhm, ± 0.1%, 63 mW, 0402 [1005 Metric], Thin Film, High Precision High Stability; Manufacturer: Yageo; Manufacturer Part Number: RT0402BRD0739KL; Voltage Rating: 50V; Power Rating: 62.5mW; Max Power Dissipation: 63mW; Temperature Coefficient: 25ppm/°C; Supplier: Future Electronics; Supplier Part Number: 3128457; RoHS: Yes; Category: Chip SMD Resistors; Stock: 10000; Pricing: 10000=0.0211, 20000=0.0206, 30000=0.0203, 50000=0.02, 100000=0.0193 (USD); Case/Package: 0402; Case Code (Metric): 1005; Case Code (Imperial): 0402; Min Operating Temperature: -55°C; Max Operating Temperature: 155°C; Tolerance: 0.1%; Packaging: Tape and Reel; Number of Terminations: 2; Termination: SMD/SMT; Voltage Rating (DC): 50V; Features: Moisture Resistant; Series: RT; Length: 0.039inch; Width: 0.02inch; Height: 0.014inch; Lead Free: Lead Free; RoHS Compliant: Yes; ComponentLink1URL: http://www.mouser.com/ds/2/447/yageodocoutput-1125656.pdf?src-supplier=Mouser; ComponentLink1Description: http://www.mouser.com/ds/2/447/yageodocoutput-1125656.pdf?src-supplier=Mouser; ComponentLink2URL: http://www.yageo.com/documents/recent/PYu-RT_1-to-0.01_RoHS_L_7.pdf?src-supplier=Digikey; ComponentLink2Description: http://www.yageo.com/documents/recent/PYu-RT_1-to-0.01_RoHS_L_7.pdf?src-supplier=Digikey; ComponentLink3URL: http://www.yageo.com/documents/recent/PYu-RT_1-to-0.01_RoHS_L_9.pdf?src-supplier=Digikey; ComponentLink3Description: http://www.yageo.com/documents/recent/PYu-RT_1-to-0.01_RoHS_L_9.pdf?src-supplier=Digikey
footprint R 0402 (1005 Metric) (Chip Capacitor, Body 1.0x0.5mm, IPC High Density)
pins: 1 B, 2 A

## RT0402BRD0740K2L
designator R?  value 40.2kR  (hidden comment: *)
Res Thin Film 0402 40.2K Ohm 0.1% 1/16W ±25ppm/°C Molded SMD Paper T/R; Manufacturer: Yageo; Manufacturer Part Number: RT0402BRD0740K2L; Voltage Rating: 50V; Power Rating: 62.5mW; Max Power Dissipation: 63mW; Case/Packuge: 0402; Supplier: Arrow Electronics; Supplier Part Number: RT0402BRD0740K2L; RoHS: Yes; Category: Chip SMD Resistors; Stock: 12390; Pricing: 1=0.15, 10=0.113, 25=0.0896, 100=0.0737, 250=0.0731, 500=0.0612, 1000=0.044, 3000=0.0387, 6000=0.0364 (USD); Case/Package: 0402; Case Code (Metric): 1005; Case Code (Imperial): 0402; Min Operating Temperature: -55°C; Max Operating Temperature: 155°C; Tolerance: 0.1%; Packaging: Tape and Reel; Termination: SMD/SMT; Number of Terminations: 2; Temperature Coefficient: 25ppm/°C; Voltage Rating (DC): 50V; Features: Moisture Resistant; Series: RT; Length: 0.039inch; Width: 0.02inch; Height: 0.014inch; Lead Free: Lead Free; RoHS Compliant: Yes; ComponentLink1URL: https://datasheet.ciiva.com/12726/pyu-rt-1-to-0-05-rohs-l-4-12726105.pdf?src-supplier=Mouser; ComponentLink1Description: https://datasheet.ciiva.com/12726/pyu-rt-1-to-0-05-rohs-l-4-12726105.pdf?src-supplier=Mouser
footprint R 0402 (1005 Metric) (Chip Capacitor, Body 1.0x0.5mm, IPC High Density)
pins: 1 B, 2 A